# Altium footprint library En.PcbLib: 240 footprints (part 13 of 15)
Each footprint in its own frame and in the unit in brackets; x right, y up, seen from the top. Pads: shape width x height; smd on the part's side, far side on the other; paste and mask are expansions set on the pad; w line width, h text height; cw(c..) or ccw(c..) is an arc to the next point about the centre after c.
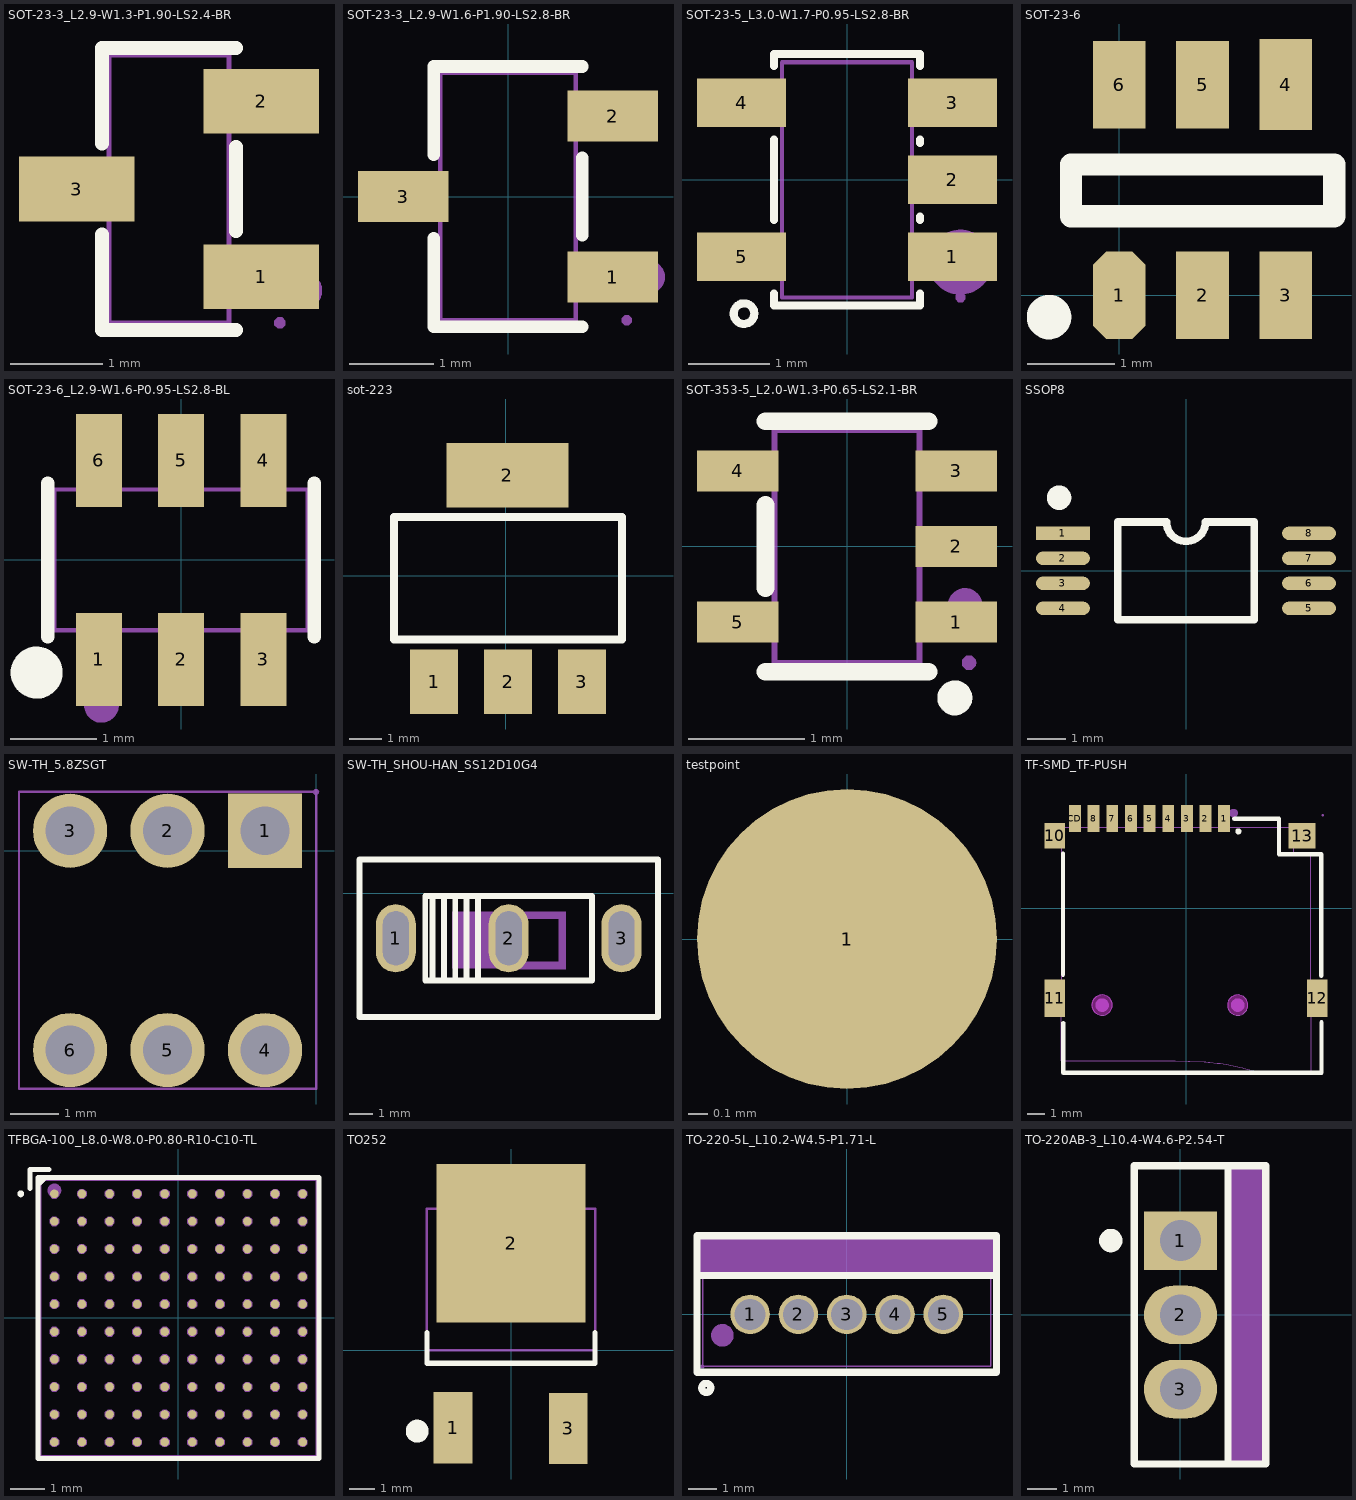
[diagram p12: the footprints below, top view; thin cyan lines are the x and y axes]

## SOT-23-3_L2.9-W1.3-P1.90-LS2.4-BR [mm]
pads (3):
  rect 1.25x0.7 smd: 1(6.562,-4.885) 2(6.562,-2.985) 3(4.562,-3.935)
Top Overlay:
  lines w0.152: 4.836,-4.429 4.836,-5.461 6.288,-5.461 ; 4.836,-3.44 4.836,-2.409 6.288,-2.409 ; 6.288,-4.39 6.288,-3.479
Mechanical 6:
  circle w0.2: c7.022,-5.035 r0.1
Mechanical 15:
  region: 6.822,-5.385 6.821,-5.36 6.786,-5.326 6.738,-5.326 6.703,-5.36 6.702,-5.385 6.703,-5.409 6.738,-5.443 6.786,-5.443 6.821,-5.409
  region: 6.202,-3.2 6.202,-2.77 6.472,-2.77 6.472,-3.2
  region: 6.462,-3.2 6.462,-2.77 6.762,-2.77 6.762,-3.2
  region: 6.202,-5.1 6.202,-4.67 6.472,-4.67 6.472,-5.1
  region: 6.462,-5.1 6.462,-4.67 6.762,-4.67 6.762,-5.1
  region: 4.652,-4.15 4.652,-3.72 4.922,-3.72 4.922,-4.15
  region: 4.362,-4.15 4.362,-3.72 4.662,-3.72 4.662,-4.15
  lines w0.051: 4.912,-5.385 4.912,-2.485 6.212,-2.485 6.212,-5.385 4.912,-5.385
3D body "User Library-SOT23-3.SLDPRT": height 1.3, standoff 0, extent 4.188,-5.387 6.988,-2.487

## SOT-23-3_L2.9-W1.6-P1.90-LS2.8-BR [mm]
pads (3):
  rect 1.07x0.6 smd: 1(1.235,-0.95) 2(1.235,0.95) 3(-1.235,0)
Top Overlay:
  lines w0.152: -0.876,-0.495 -0.876,-1.536 0.876,-1.536 ; -0.876,0.495 -0.876,1.536 0.876,1.536 ; 0.876,-0.455 0.876,0.455
Mechanical 6:
  circle w0.2: c1.651,-0.95 r0.1
Mechanical 15:
  region: 1.46,-1.46 1.46,-1.435 1.425,-1.4 1.375,-1.4 1.34,-1.435 1.34,-1.46 1.34,-1.485 1.375,-1.52 1.425,-1.52 1.46,-1.485
  region: 0.95,-1.15 0.95,-0.75 1.4,-0.75 1.4,-1.15
  region: 0.79,-1.15 0.79,-0.75 0.96,-0.75 0.96,-1.15
  region: 0.95,0.75 0.95,1.15 1.4,1.15 1.4,0.75
  region: 0.79,0.75 0.79,1.15 0.96,1.15 0.96,0.75
  region: -0.95,-0.2 -0.95,0.2 -1.4,0.2 -1.4,-0.2
  region: -0.96,-0.2 -0.96,0.2 -0.79,0.2 -0.79,-0.2
  lines w0.051: -0.8,-1.46 -0.8,1.46 0.8,1.46 0.8,-1.46 -0.8,-1.46
3D body "gr6206p252mr-g.step": height 1.4, standoff 0, extent -1.4,-1.45 1.4,1.45

## SOT-23-5_L3.0-W1.7-P0.95-LS2.8-BR [mm]
pads (5):
  rect 1.1x0.6 smd: 1(1.3,-0.95) 2(1.3,0) 3(1.3,0.95) 4(-1.3,0.95) 5(-1.3,-0.95)
Top Overlay:
  circle w0.1: c-1.27,-1.651 r0.127
  lines w0.1: -0.9,-1.404 -0.9,-1.55 0.9,-1.55 0.9,-1.404 ; -0.9,-0.496 -0.9,0.496 ; -0.9,1.404 -0.9,1.55 0.9,1.55 0.9,1.404 ; 0.9,-0.496 0.9,-0.454 ; 0.9,0.454 0.9,0.496
Mechanical 6:
  circle w0.4: c1.397,-1.016 r0.2
Mechanical 15:
  region: 1.46,-1.45 1.46,-1.425 1.425,-1.39 1.375,-1.39 1.34,-1.425 1.34,-1.45 1.34,-1.475 1.375,-1.51 1.425,-1.51 1.46,-1.475
  region: 0.79,-1.15 0.79,-0.75 0.96,-0.75 0.96,-1.15
  region: 0.95,-1.15 0.95,-0.75 1.4,-0.75 1.4,-1.15
  region: 0.79,-0.2 0.79,0.2 0.96,0.2 0.96,-0.2
  region: 0.95,-0.2 0.95,0.2 1.4,0.2 1.4,-0.2
  region: 0.79,0.75 0.79,1.15 0.96,1.15 0.96,0.75
  region: 0.95,0.75 0.95,1.15 1.4,1.15 1.4,0.75
  region: -0.96,0.75 -0.96,1.15 -0.79,1.15 -0.79,0.75
  region: -1.4,0.75 -1.4,1.15 -0.95,1.15 -0.95,0.75
  region: -0.96,-1.15 -0.96,-0.75 -0.79,-0.75 -0.79,-1.15
  region: -1.4,-1.15 -1.4,-0.75 -0.95,-0.75 -0.95,-1.15
  lines w0.051: -0.8,-1.45 0.8,-1.45 0.8,1.45 -0.8,1.45 -0.8,-1.45
3D body "ALSRobot-SOT23-5R.SLDPRT": height 1.3, standoff 0, extent -1.5,-1.5 1.5,1.5

## SOT-23-6 [mm] "SOT-23-6"
pads (6):
  oct 0.6x1 smd: 1(0,0)
  rect 0.6x1 smd: 2(0.95,0) 3(1.9,0) 5(0.95,2.4) 6(0,2.4)
  rect 0.6x1.04 smd: 4(1.9,2.4)
Top Overlay:
  circle w0.254: c-0.8,-0.25 r0.127
  lines w0.254: -0.55,0.9 2.45,0.9 2.45,1.49 -0.55,1.49 -0.55,0.9
3D body "ch217k.step": height 1.6, standoff -0.05, extent -0.5,-0.136 2.4,2.676

## SOT-23-6_L2.9-W1.6-P0.95-LS2.8-BL [mm]
pads (6):
  rect 0.532x1.072 smd: 1(-0.95,-1.149) 2(0,-1.149) 3(0.95,-1.149) 4(0.95,1.149) 5(0,1.149) 6(-0.95,1.149)
Top Overlay:
  circle w0.3: c-1.668,-1.301 r0.15
  lines w0.152: -1.539,-0.889 -1.539,0.889 ; 1.539,-0.889 1.539,0.889
Mechanical 6:
  circle w0.2: c-0.92,-1.68 r0.1
Mechanical 15:
  region: -1.403,-1.4 -1.404,-1.376 -1.439,-1.341 -1.488,-1.341 -1.522,-1.376 -1.523,-1.4 -1.522,-1.425 -1.487,-1.459 -1.438,-1.459 -1.404,-1.424
  region: -1.165,-0.925 -0.735,-0.925 -0.735,-1.4 -1.165,-1.4
  region: -1.165,-0.803 -0.735,-0.803 -0.735,-0.935 -1.165,-0.935
  region: -0.215,-0.925 0.215,-0.925 0.215,-1.4 -0.215,-1.4
  region: -0.215,-0.803 0.215,-0.803 0.215,-0.935 -0.215,-0.935
  region: 0.735,-0.925 1.165,-0.925 1.165,-1.4 0.735,-1.4
  region: 0.735,-0.803 1.165,-0.803 1.165,-0.935 0.735,-0.935
  region: 0.735,0.925 1.165,0.925 1.165,1.4 0.735,1.4
  region: 0.735,0.935 1.165,0.935 1.165,0.803 0.735,0.803
  region: -0.215,0.925 0.215,0.925 0.215,1.4 -0.215,1.4
  region: -0.215,0.935 0.215,0.935 0.215,0.803 -0.215,0.803
  region: -1.165,0.925 -0.735,0.925 -0.735,1.4 -1.165,1.4
  region: -1.165,0.935 -0.735,0.935 -0.735,0.803 -1.165,0.803
  lines w0.051: -1.463,-0.813 1.463,-0.813 1.463,0.813 -1.463,0.813 -1.463,-0.813
3D body "User Library-SOT-23-6.SLDPRT": height 1.09, standoff 0, extent -1.397,-1.213 1.397,1.213

## sot-223 [mil]
pads (4):
  rect 59x79 smd: 1(-88,-130) 2(2.55,-130) 3(93.1,-130)
  rect 150x79 smd: 2(1.88,123.54)
Top Overlay:
  lines w10: -137.45,-78 -137.45,72 142.55,72 142.55,-78 -137.45,-78
3D body "SOT-223_MP04A.STEP": height 66.93, standoff 0, extent -126.41,-138.72 129.5,135.3

## SOT-353-5_L2.0-W1.3-P0.65-LS2.1-BR [mm]
pads (5):
  rect 0.7x0.35 smd: 1(0.94,-0.65) 2(0.94,0) 3(0.94,0.65) 4(-0.94,0.65) 5(-0.94,-0.65)
Top Overlay:
  circle w0.15: c0.927,-1.303 r0.075
  lines w0.152: -0.701,-1.076 0.701,-1.076 ; -0.701,-0.358 -0.701,0.358 ; -0.701,1.076 0.701,1.076
Mechanical 6:
  circle w0.15: c1.016,-0.508 r0.075
Mechanical 15:
  region: 1.05,-0.55 0.75,-0.55 0.75,-0.75 1.05,-0.75
  region: 0.76,-0.55 0.615,-0.55 0.615,-0.75 0.76,-0.75
  region: 1.05,0.1 0.75,0.1 0.75,-0.1 1.05,-0.1
  region: 0.76,0.1 0.615,0.1 0.615,-0.1 0.76,-0.1
  region: 1.05,0.75 0.75,0.75 0.75,0.55 1.05,0.55
  region: 0.76,0.75 0.615,0.75 0.615,0.55 0.76,0.55
  region: -1.05,0.75 -0.75,0.75 -0.75,0.55 -1.05,0.55
  region: -0.76,0.75 -0.615,0.75 -0.615,0.55 -0.76,0.55
  region: -1.05,-0.55 -0.75,-0.55 -0.75,-0.75 -1.05,-0.75
  region: -0.76,-0.55 -0.615,-0.55 -0.615,-0.75 -0.76,-0.75
  region: 1.11,-1 1.109,-0.976 1.074,-0.942 1.026,-0.942 0.991,-0.976 0.99,-1 0.991,-1.024 1.026,-1.058 1.074,-1.058 1.109,-1.024
  lines w0.051: -0.625,-1 0.625,-1 0.625,1 -0.625,1 -0.625,-1
3D body "sn74lvc1g125dc(lx).step": height 1.14, standoff -0.02, extent -1.05,-1.075 1.05,1.075

## SSOP8 [mm] "3*6.4*1.2mm（蒜米工坊）"
height 9.4
pads (8):
  rect 1.4x0.35 smd: 1(-3.2,0.975)
  oval 1.4x0.35 smd: 2(-3.2,0.325) 3(-3.2,-0.325) 4(-3.2,-0.975) 5(3.2,-0.975) 6(3.2,-0.325) 7(3.2,0.325) 8(3.2,0.975)
Top Overlay:
  circle w0.381: c-3.3,1.9 r0.127
  lines w0.2: -1.778,-1.27 1.778,-1.27 1.778,1.27 0.508,1.27 cw(c0,1.27) -0.508,1.27 -1.778,1.27 -1.778,-1.27
3D body "SSOP8.STEP": height 1.25, standoff -0.03, extent -3.202,-1.75 3.202,1.75

## SW-TH_5.8ZSGT [mil]
pads (6):
  rect 60x60 hole 39.37: 1(-41.26,16.22)
  round 60 hole 39.37: 2(-120,16.22) 3(-198.74,16.22) 4(-41.26,-160.95) 5(-120,-160.95) 6(-198.74,-160.95)
Bottom Overlay:
  lines w10: -227.53,-187.37 -235,-187.37 -235,42.63 -227.53,42.63 ; -169.95,-187.37 -148.79,-187.37 ; -169.95,42.63 -148.79,42.63 ; -91.21,-187.37 -70.05,-187.37 ; -91.21,42.63 -70.05,42.63 ; -12.47,-187.37 -5,-187.37 -5,42.63 -12.47,42.63 ; -175,-117.36 -175,-32.36 -65,-32.36 -65,-117.36 -175,-117.36
Mechanical 15:
  region: -25.52,16.22 -25.57,13.12 -28.01,7.42 -32.42,3.08 -38.16,0.73 -44.36,0.73 -50.09,3.08 -54.51,7.42 -56.95,13.12 -57,16.22 -56.95,19.32 -54.51,25.02 -50.09,29.36 -44.36,31.71 -38.16,31.71 -32.42,29.36 -28.01,25.02 -25.57,19.32
  region: -104.26,16.22 -104.31,13.12 -106.75,7.42 -111.16,3.08 -116.9,0.73 -123.1,0.73 -128.83,3.08 -133.25,7.42 -135.69,13.12 -135.74,16.22 -135.69,19.32 -133.25,25.02 -128.83,29.36 -123.1,31.71 -116.9,31.71 -111.16,29.36 -106.75,25.02 -104.31,19.32
  region: -183,16.22 -183.05,13.12 -185.49,7.42 -189.9,3.08 -195.64,0.73 -201.84,0.73 -207.57,3.08 -211.99,7.42 -214.43,13.12 -214.48,16.22 -214.43,19.32 -211.99,25.02 -207.57,29.36 -201.84,31.71 -195.64,31.71 -189.9,29.36 -185.49,25.02 -183.05,19.32
  region: -183,-160.95 -183.05,-164.05 -185.49,-169.75 -189.9,-174.09 -195.64,-176.44 -201.84,-176.44 -207.57,-174.09 -211.99,-169.75 -214.43,-164.05 -214.48,-160.95 -214.43,-157.85 -211.99,-152.15 -207.57,-147.81 -201.84,-145.46 -195.64,-145.46 -189.9,-147.81 -185.49,-152.15 -183.05,-157.85
  region: -104.26,-160.95 -104.31,-164.05 -106.75,-169.75 -111.16,-174.09 -116.9,-176.44 -123.1,-176.44 -128.83,-174.09 -133.25,-169.75 -135.69,-164.05 -135.74,-160.95 -135.69,-157.85 -133.25,-152.15 -128.83,-147.81 -123.1,-145.46 -116.9,-145.46 -111.16,-147.81 -106.75,-152.15 -104.31,-157.85
  region: -25.52,-160.95 -25.57,-164.05 -28.01,-169.75 -32.42,-174.09 -38.16,-176.44 -44.36,-176.44 -50.09,-174.09 -54.51,-169.75 -56.95,-164.05 -57,-160.95 -56.95,-157.85 -54.51,-152.15 -50.09,-147.81 -44.36,-145.46 -38.16,-145.46 -32.42,-147.81 -28.01,-152.15 -25.57,-157.85
  region: 2.36,47.64 2.34,46.68 0.96,45.33 -0.96,45.33 -2.34,46.68 -2.36,47.64 -2.34,48.6 -0.96,49.95 0.96,49.95 2.34,48.6
  lines w2: -240,-192.37 -240,47.63 0,47.63 0,-192.37 -240,-192.37
3D body "5.8 zsgt.step": height 393.7, standoff -141.73, extent -238.35,-189.17 -10,39.17

## SW-TH_SHOU-HAN_SS12D10G4 [mm]
pads (3):
  oval 1.7x2.9 hole 1.1 slot 2.3 at 90 deg paste-2539.97 mask+0.05: 1(23.327,-1.924) 2(28.127,-1.924) 3(32.927,-1.924)
Top Overlay:
  lines w0.254: 24.885,-3.724 24.894,-3.724 24.894,-0.124 ; 25.365,-3.724 25.374,-3.724 25.374,-0.124 ; 25.844,-3.724 25.854,-3.724 25.854,-0.124 ; 26.324,-3.724 26.334,-3.724 26.334,-0.124 ; 26.813,-0.124 26.813,-3.724 26.87,-3.724 ; 30.444,-0.124 30.867,-0.124 ; 30.577,-0.124 24.577,-0.124 24.577,-3.724 31.677,-3.724 31.677,-0.624 31.677,-0.124 30.677,-0.124 ; 21.777,-5.274 21.777,1.426 34.477,1.426 34.477,-5.274 21.777,-5.274
Mechanical 6:
  region: 25.727,-0.794 28.127,-0.794 28.127,-3.194 25.727,-3.194
  region: 28.114,-0.795 30.514,-0.795 30.552,-0.795 30.552,-1.098 28.112,-1.098 28.112,-0.998
  region: 30.251,-3.235 30.251,-0.835 30.251,-0.797 30.555,-0.797 30.555,-3.237 30.454,-3.237
  region: 28.106,-2.931 30.506,-2.931 30.543,-2.931 30.543,-3.235 28.104,-3.235 28.104,-3.134
  region: 28.107,-3.225 28.107,-0.825 28.107,-0.787 28.411,-0.787 28.411,-3.227 28.311,-3.227
Mechanical 15:
  region: 21.837,-5.274 21.837,-5.249 21.802,-5.214 21.752,-5.214 21.717,-5.249 21.717,-5.274 21.717,-5.299 21.752,-5.334 21.802,-5.334 21.837,-5.299
  region: 22.927,-1.274 23.727,-1.274 23.727,-2.574 22.927,-2.574
  region: 27.727,-1.274 28.527,-1.274 28.527,-2.574 27.727,-2.574
  region: 32.527,-1.274 33.327,-1.274 33.327,-2.574 32.527,-2.574
  lines w0.051: 21.777,-5.274 21.777,1.426 34.477,1.426 34.477,-5.274 21.777,-5.274
3D body "User Library-SS-12D10L4.step": height 10.1, standoff -7, extent 21.567,-5.276 34.567,1.524

## testpoint [mil]
pads (1):
  round 60 smd: 1(0,0)

## TF-SMD_TF-PUSH [mm]
pads (13):
  rect 0.7x1.6 smd: 1(2.25,5.3) 2(1.15,5.3) 3(0.05,5.3) 4(-1.05,5.3) 5(-2.15,5.3) 6(-3.25,5.3) 7(-4.35,5.3) 8(-5.45,5.3) CD(-6.55,5.3)
  rect 1.2x1.5 smd: 10(-7.75,4.3)
  rect 1.2x2.2 smd: 11(-7.75,-5.3) 12(7.75,-5.3)
  rect 1.6x1.5 smd: 13(6.85,4.3)
Top Overlay:
  circle w0.254: c3.087,4.552 r0.052
  lines w0.254: -7.26,-3.91 -7.26,3.25 ; -7.24,-6.76 -7.24,-9.7 8,-9.7 8,-6.71 ; 2.85,5.3 4.702,5.3 5.489,5.3 5.489,3.199 5.5,3.2 ; 5.49,3.2 7.98,3.2 7.98,-3.969
Keep-Out Layer:
  board cut-out: -4.35,-5.7 -4.35,-5.581 -4.441,-5.36 -4.61,-5.191 -4.831,-5.1 -5.069,-5.1 -5.29,-5.191 -5.459,-5.36 -5.55,-5.581 -5.55,-5.7 -5.55,-5.819 -5.459,-6.04 -5.29,-6.209 -5.069,-6.3 -4.831,-6.3 -4.61,-6.209 -4.441,-6.04 -4.35,-5.819
  board cut-out: 3.65,-5.7 3.65,-5.581 3.559,-5.36 3.39,-5.191 3.169,-5.1 2.931,-5.1 2.71,-5.191 2.541,-5.36 2.45,-5.581 2.45,-5.7 2.45,-5.819 2.541,-6.04 2.71,-6.209 2.931,-6.3 3.169,-6.3 3.39,-6.209 3.559,-6.04 3.65,-5.819
Mechanical 1:
  circle w0.005: c-4.95,-5.7 r0.6
  circle w0.005: c3.05,-5.7 r0.6
Mechanical 6:
  circle w0.4: c3.05,-5.7 r0.2
  circle w0.4: c-4.95,-5.7 r0.2
  circle w0.254: c2.81,5.63 r0.127
Mechanical 15:
  region: 8.13,5.505 8.129,5.529 8.094,5.562 8.046,5.562 8.011,5.529 8.01,5.505 8.011,5.481 8.046,5.448 8.094,5.448 8.129,5.481
  region: -6.7,5.505 -6.4,5.505 -6.4,4.805 -6.7,4.805
  region: -5.6,5.505 -5.3,5.505 -5.3,4.805 -5.6,4.805
  region: -4.5,5.505 -4.2,5.505 -4.2,4.805 -4.5,4.805
  region: -3.4,5.505 -3.1,5.505 -3.1,4.805 -3.4,4.805
  region: -2.3,5.505 -2,5.505 -2,4.805 -2.3,4.805
  region: -1.2,5.505 -0.9,5.505 -0.9,4.805 -1.2,4.805
  region: -0.1,5.505 0.2,5.505 0.2,4.805 -0.1,4.805
  region: 1,5.505 1.3,5.505 1.3,4.805 1,4.805
  region: 2.1,5.505 2.4,5.505 2.4,4.805 2.1,4.805
  region: -7.37,3.806 -8.069,3.806 -8.07,4.806 -7.383,4.806 -7.382,4.805 -7.384,4.498
  region: 6.481,3.805 7.181,3.805 7.181,4.805 6.494,4.805 6.469,4.806 6.472,4.752 6.473,4.671 6.474,4.498
  region: -7.369,-6.094 -7.37,-4.494 -8.069,-4.494 -8.069,-6.094 -8.009,-6.094
  region: 8.069,-6.092 8.068,-4.492 7.369,-4.492 7.369,-6.091 7.429,-6.091
  lines w0.051: -8.07,4.806 -8.07,3.806 -7.37,3.806 -7.37,-4.494 -8.07,-4.494 -8.07,-6.094 -7.37,-6.094 -7.37,-8.994 -6.352,-8.995 -2.476,-8.986 -1.695,-8.99 -0.648,-8.989 0.138,-8.999 0.232,-9.003 1.09,-9.042 1.163,-9.05 1.308,-9.069 1.414,-9.075 1.841,-9.121 2.012,-9.136 2.38,-9.204 3.048,-9.34 3.176,-9.371 3.348,-9.403 3.411,-9.421 3.876,-9.552 4.14,-9.628 4.388,-9.695 4.389,-9.694 7.379,-9.694 7.38,-9.693 7.38,-6.094 8.07,-6.094 ; -8.07,4.806 -8.07,4.806 ; -8.07,4.806 7.181,4.806 ; 7.181,4.806 7.181,4.806 ; 7.181,4.806 7.181,3.806 7.181,3.806 6.33,3.806 6.33,3.306 7.229,3.306 7.229,3.206 7.37,3.206 7.37,-4.494 7.37,-4.494 8.069,-4.494 8.07,-4.495 8.07,-6.094 ; 8.07,-6.094 8.07,-6.094
3D body "User Library-MEM2055-00-190-01-A_revG.SLDPRT": height 1.85, standoff -0.6, extent -8.066,-9.652 7.934,5.598

## TFBGA-100_L8.0-W8.0-P0.80-R10-C10-TL [mm]
pads (100):
  round 0.25 smd paste+0 mask+0.038: A1(-3.6,3.6) A2(-2.8,3.6) A3(-2,3.6) A4(-1.2,3.6) A5(-0.4,3.6) A6(0.4,3.6) A7(1.2,3.6) A8(2,3.6) A9(2.8,3.6) A10(3.6,3.6) B1(-3.6,2.8) B2(-2.8,2.8) B3(-2,2.8) B4(-1.2,2.8) B5(-0.4,2.8) B6(0.4,2.8) B7(1.2,2.8) B8(2,2.8) B9(2.8,2.8) B10(3.6,2.8) C1(-3.6,2) C2(-2.8,2) C3(-2,2) C4(-1.2,2) C5(-0.4,2) C6(0.4,2) C7(1.2,2) C8(2,2) C9(2.8,2) C10(3.6,2) D1(-3.6,1.2) D2(-2.8,1.2) D3(-2,1.2) D4(-1.2,1.2) D5(-0.4,1.2) D6(0.4,1.2) D7(1.2,1.2) D8(2,1.2) D9(2.8,1.2) D10(3.6,1.2) E1(-3.6,0.4) E2(-2.8,0.4) E3(-2,0.4) E4(-1.2,0.4) E5(-0.4,0.4) E6(0.4,0.4) E7(1.2,0.4) E8(2,0.4) E9(2.8,0.4) E10(3.6,0.4) F1(-3.6,-0.4) F2(-2.8,-0.4) F3(-2,-0.4) F4(-1.2,-0.4) F5(-0.4,-0.4) F6(0.4,-0.4) F7(1.2,-0.4) F8(2,-0.4) F9(2.8,-0.4) F10(3.6,-0.4) G1(-3.6,-1.2) G2(-2.8,-1.2) G3(-2,-1.2) G4(-1.2,-1.2) G5(-0.4,-1.2) G6(0.4,-1.2) G7(1.2,-1.2) G8(2,-1.2) G9(2.8,-1.2) G10(3.6,-1.2) H1(-3.6,-2) H2(-2.8,-2) H3(-2,-2) H4(-1.2,-2) H5(-0.4,-2) H6(0.4,-2) H7(1.2,-2) H8(2,-2) H9(2.8,-2) H10(3.6,-2) J1(-3.6,-2.8) J2(-2.8,-2.8) J3(-2,-2.8) J4(-1.2,-2.8) J5(-0.4,-2.8) J6(0.4,-2.8) J7(1.2,-2.8) J8(2,-2.8) J9(2.8,-2.8) J10(3.6,-2.8) K1(-3.6,-3.6) K2(-2.8,-3.6) K3(-2,-3.6) K4(-1.2,-3.6) K5(-0.4,-3.6) K6(0.4,-3.6) K7(1.2,-3.6) K8(2,-3.6) K9(2.8,-3.6) K10(3.6,-3.6)
Top Overlay:
  circle w0.1: c-4.576,3.6 r0.05
  region: -4.076,4.076 -3.756,4.076 -4.076,3.756
  lines w0.152: -4.305,3.756 -4.305,4.305 -3.756,4.305 ; -4.076,-4.076 -4.076,4.076 4.076,4.076 4.076,-4.076 -4.076,-4.076
Mechanical 6:
  circle w0.2: c-3.6,3.7 r0.1
  region: -4.076,4.076 -3.756,4.076 -4.076,3.756
Mechanical 15:
  drawing of 105 lines, arcs and shapes, not listed
3D body "stm32h723vgh6.step": height 1.1, standoff 0, extent -4,-4 4,4

## TO252 [mil] "252晶体管"
height 370.08
pads (3):
  rect 60x110 smd: 1(-89.55,-119.77) 3(88.45,-120.77)
  rect 230x245 smd: 2(0,165.35)
Top Overlay:
  circle w19.68: c-145,-125 r7.87
  lines w7.87: -130,27.56 -130,-20 130,-20 130,27.56
Mechanical 15:
  lines w3.94: -105.04,218.5 -105.04,236.06 -65.59,271.65 65.59,271.65 105.04,236.06 105.04,218.5 ; -130,0 130,0 130,218.5 -130,218.5 -130,0
3D body "TO252.STEP": height 90.55, standoff -0.2, extent -127.95,-120 127.95,250.84

## TO-220-5L_L10.2-W4.5-P1.71-L [mm]
pads (5):
  round 1.4 hole 1.1: 1(-3.42,0) 2(-1.71,0) 3(0,0) 4(1.71,0) 5(3.42,0)
Top Overlay:
  circle w0.254: c-4.97,-2.6 r0.16
  lines w0.258: -5.3,1.38 5.3,1.38 ; -5.3,-2.05 -5.3,2.78 5.3,2.78 5.3,-2.05 -5.3,-2.05
Mechanical 6:
  circle w0.4: c-4.4,-0.74 r0.2
  region: -5.24,2.79 5.3,2.79 5.31,2.78 5.31,1.43 5.32,1.42 -5.24,1.42 -5.25,1.41
Mechanical 15:
  region: -2.975,-0.25 -3.865,-0.25 -3.865,0.25 -2.975,0.25
  region: -1.265,-0.25 -2.155,-0.25 -2.155,0.25 -1.265,0.25
  region: 0.445,-0.25 -0.445,-0.25 -0.445,0.25 0.445,0.25
  region: 2.155,-0.25 1.265,-0.25 1.265,0.25 2.155,0.25
  region: 3.865,-0.25 2.975,-0.25 2.975,0.25 3.865,0.25
  region: -5.04,-1.84 -5.04,-1.815 -5.075,-1.78 -5.125,-1.78 -5.16,-1.815 -5.16,-1.84 -5.16,-1.865 -5.125,-1.9 -5.075,-1.9 -5.04,-1.865
  lines w0.051: -5.1,-1.84 -5.1,2.66 5.1,2.66 5.1,-1.84 -5.1,-1.84
3D body "User Library-TO220-5T PCB.SLDPRT": height 21.32, standoff -2.25, extent -5.06,-1.651 5.06,2.806
3D body "User Library-HS3_16x23x25.SLDPRT": height 25.01, standoff -4, extent -11.443,-4.062 11.557,11.938

## TO-220AB-3_L10.4-W4.6-P2.54-T [mm]
pads (3):
  rect 2.5x2 hole 1.4: 1(0,2.54)
  oval 2.5x2 hole 1.4: 2(0,0) 3(0,-2.54)
Top Overlay:
  lines w0.254: 1.625,-5.1 1.625,5.1 ; -1.579,-5.1 -1.579,5.1 2.921,5.1 2.921,-5.1 -1.579,-5.1
  lines w0.4: -2.18,2.537 cw(c-2.38,2.539) -2.18,2.54
Mechanical 6:
  region: 1.651,5.08 1.651,-5.08 2.921,-5.08 2.921,5.08
Mechanical 15:
  region: 0.6,2.54 0.599,2.658 0.506,2.877 0.338,3.043 0.119,3.133 -0.118,3.133 -0.338,3.043 -0.506,2.877 -0.599,2.659 -0.6,2.54 -0.599,2.422 -0.506,2.204 -0.338,2.037 -0.118,1.947 0.118,1.947 0.338,2.037 0.506,2.203 0.599,2.422
  region: 0.6,-2.54 0.599,-2.422 0.506,-2.203 0.338,-2.037 0.119,-1.947 -0.118,-1.947 -0.338,-2.037 -0.506,-2.203 -0.599,-2.421 -0.6,-2.54 -0.599,-2.658 -0.506,-2.876 -0.338,-3.043 -0.118,-3.133 0.118,-3.133 0.338,-3.043 0.506,-2.877 0.599,-2.658
  region: 0.6,0 0.599,0.118 0.506,0.337 0.338,0.503 0.119,0.593 -0.118,0.593 -0.338,0.503 -0.506,0.337 -0.599,0.119 -0.6,0 -0.599,-0.118 -0.506,-0.336 -0.338,-0.503 -0.118,-0.593 0.118,-0.593 0.338,-0.503 0.506,-0.337 0.599,-0.118
  region: 2.96,5.1 2.959,5.124 2.924,5.157 2.876,5.157 2.841,5.124 2.84,5.1 2.841,5.076 2.876,5.042 2.924,5.042 2.959,5.076
  lines w0.051: -1.6,-5.1 -1.6,5.1 2.9,5.1 2.9,-5.1 -1.6,-5.1
3D body "User Library-TO-220 Con Disipador 34M8491_Disipador 34M8491.SLDPRT": height 25.4, standoff -3.1, extent 1.881,-5.919 8.382,6.681
3D body "User Library-TO-220 Con Disipador 34M8491_TO220-SHORT.SLDPRT": height 21.71, standoff -3.09, extent -1.397,-5.28 3.293,5.28